# Altium footprint library 接插件.PcbLib: 88 footprints (part 6 of 6)
Each footprint in its own frame and in the unit in brackets; x right, y up, seen from the top. Pads: shape width x height; smd on the part's side, far side on the other; paste and mask are expansions set on the pad; w line width, h text height; cw(c..) or ccw(c..) is an arc to the next point about the centre after c.
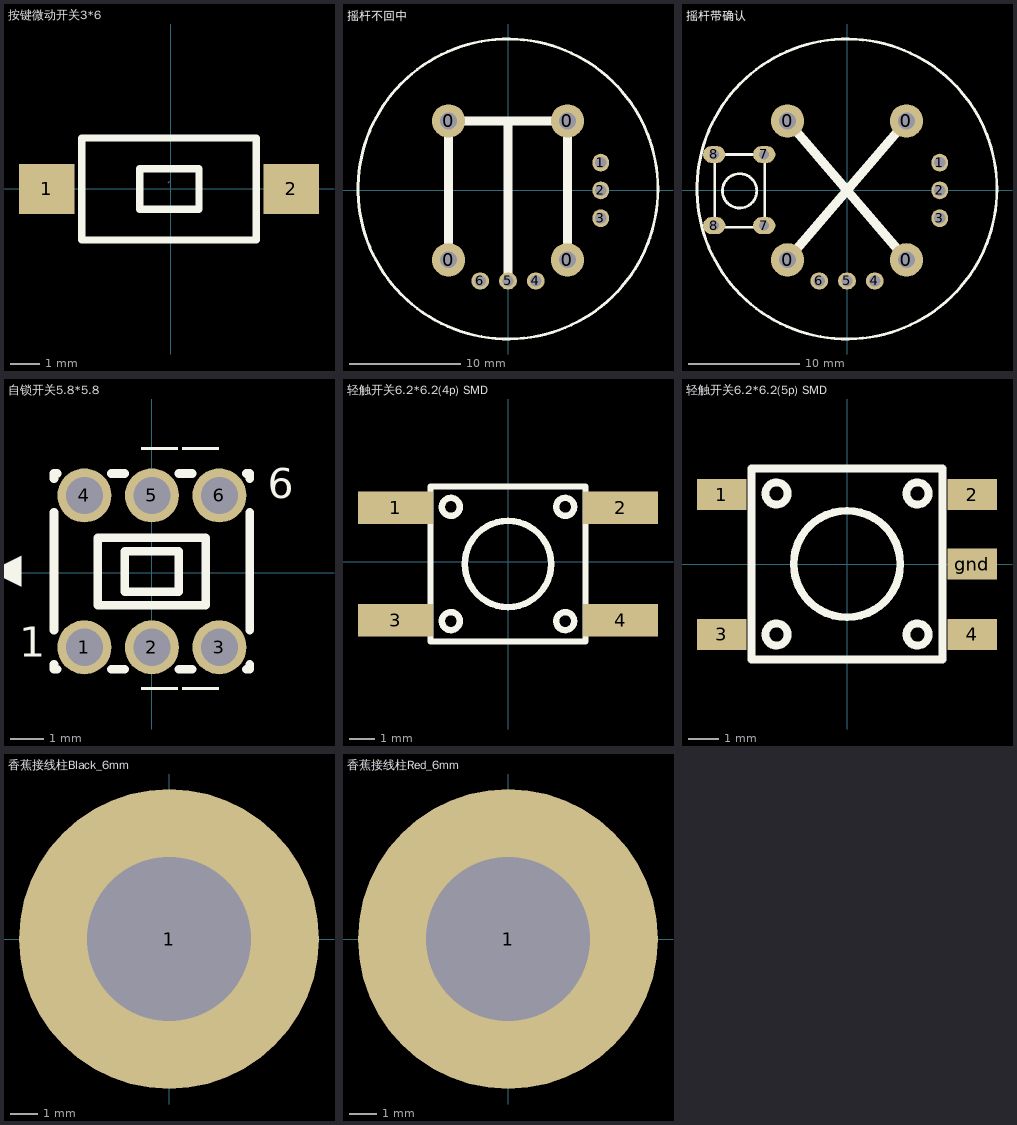
[diagram p5: the footprints below, top view; thin cyan lines are the x and y axes]

## 按键微动开关3*6 [mm]
pads (2):
  rect 1.9x1.7 smd: 1(-4.257,0) 2(4.143,0)
Top Overlay:
  lines w0.254: -3.057,-1.75 2.943,-1.75 2.943,1.75 -3.057,1.75 -3.057,-1.75 ; -1.058,-0.701 -1.058,0.701 0.974,0.701 0.974,-0.701 -1.058,-0.701
Mechanical 15:
  lines w0.003: -0.082,0.211 -0.032,0.262

## 摇杆不回中 [mm]
pads (10):
  round 3 hole 1.5: 0(-5.35,-6.25) 0(-5.35,6.25) 0(5.35,-6.25) 0(5.35,6.25)
  oval 1.524x1.6 hole 1: 1(8.35,2.5) 2(8.35,0) 3(8.35,-2.5)
  oval 1.6x1.524 hole 1: 4(2.5,-8.15) 5(0,-8.15) 6(-2.5,-8.15)
Top Overlay:
  circle w0.254: c0,0.127 r13.5
  lines w0.838: -5.35,-6.25 -5.35,6.25 5.35,6.25 5.35,-6.25 ; 0,-8.15 0,6.25
3D body "User Library-alps joystick module.STEP": height 19, standoff -4.3, extent -16.153,-11.977 11.723,9.323

## 摇杆带确认 [mm]
pads (14):
  round 3 hole 1.5: 0(-5.35,-6.25) 0(-5.35,6.25) 0(5.35,-6.25) 0(5.35,6.25)
  oval 1.524x1.6 hole 1: 1(8.35,2.5) 2(8.35,0) 3(8.35,-2.5)
  oval 1.6x1.524 hole 1: 4(2.5,-8.15) 5(0,-8.15) 6(-2.5,-8.15)
  oval 2x1.524 hole 0.9: 7(-7.449,-3.164) 7(-7.449,3.236) 8(-11.949,-3.164) 8(-11.949,3.236)
Top Overlay:
  circle w0.254: c0,0.127 r13.5
  circle w0.254: c-9.663,-0.041 r1.547
  lines w0.254: -11.949,3.236 -7.449,3.236 ; -11.902,3.189 -11.902,-3.315 -7.402,-3.315 -7.402,3.189
  lines w0.838: -5.35,-6.25 5.35,6.25 ; -5.35,6.25 5.35,-6.25
3D body "User Library-alps joystick module.STEP": height 19, standoff -4.3, extent -16.026,-11.85 11.85,9.45

## 自锁开关5.8*5.8 [mm] "PB12E06371， GANGYUAN(港源)"
pads (6):
  round 1.6 hole 1.1: 1(-2,-2.214) 2(0,-2.214) 3(2,-2.214) 4(-2,2.286) 5(0,2.286) 6(2,2.286)
Top Overlay:
  lines w0.254: -2.9,-2.714 -2.9,-2.864 -2.8,-2.864 ; -2.9,-1.713 -2.9,1.785 ; -2.9,2.787 -2.9,2.936 -2.8,2.936 ; -1.2,-2.864 -0.8,-2.864 ; -1.2,2.936 -0.8,2.936 ; 0.8,-2.864 1.2,-2.864 ; 0.8,2.936 1.2,2.936 ; 2.8,-2.864 2.9,-2.864 2.9,-2.714 ; 2.8,2.936 2.9,2.936 2.9,2.787 ; 2.9,-1.713 2.9,1.785 ; -1.6,-0.964 1.6,-0.964 1.6,1.036 -1.6,1.036 -1.6,-0.964 ; -0.8,-0.564 0.8,-0.564 0.8,0.636 -0.8,0.636 -0.8,0.436 -0.8,-0.564
  text "——" at -0.381,3.048 h1.52
  text "——" at -0.381,-4.064 h1.52
  text "▲" at -3.703,-0.432 h1.52
  text "1" at -3.937,-2.794 h1.52
  text "6" at 3.429,1.905 h1.52

## 轻触开关6.2*6.2(4p) SMD [mm]
pads (4):
  rect 3x1.3 smd: 1(-4.514,2.151) 2(4.486,2.151) 3(-4.514,-2.349) 4(4.486,-2.349)
Top Overlay:
  circle w0.254: c-0.014,-0.099 r1.727
  circle w0.254: c-2.299,2.187 r0.359
  circle w0.254: c2.272,2.187 r0.359
  circle w0.254: c-2.299,-2.385 r0.359
  circle w0.254: c2.272,-2.385 r0.359
  lines w0.254: -3.114,-3.199 3.086,-3.199 3.086,3.001 -3.114,3.001 -3.114,-3.199

## 轻触开关6.2*6.2(5p) SMD [mm]
pads (5):
  rect 1.6x1 smd: 1(-4.064,2.25) 2(4.064,2.25) 3(-4.064,-2.286) 4(4.064,-2.286) gnd(4.064,0)
Top Overlay:
  circle w0.254: c0,0 r1.727
  circle w0.254: c-2.286,2.286 r0.359
  circle w0.254: c2.286,2.286 r0.359
  circle w0.254: c-2.286,-2.286 r0.359
  circle w0.254: c2.286,-2.286 r0.359
  lines w0.254: -3.1,-3.1 3.1,-3.1 3.1,3.1 -3.1,3.1 -3.1,-3.1

## 香蕉接线柱Black_6mm [mm]
pads (1):
  round 11 hole 6: 1(0,0)
3D body "User Library-black connecter.x_t": height 9, standoff -6, extent -5.5,-5.5 5.5,13.499

## 香蕉接线柱Red_6mm [mm]
pads (1):
  round 11 hole 6: 1(0,0)
3D body "User Library-red connecter.step": height 9, standoff -6, extent -5.5,-5.5 5.5,13.498